# Altium footprint library Connectors.PcbLib: 101 footprints (part 7 of 7)
Each footprint in its own frame and in the unit in brackets; x right, y up, seen from the top. Pads: shape width x height; smd on the part's side, far side on the other; paste and mask are expansions set on the pad; w line width, h text height; cw(c..) or ccw(c..) is an arc to the next point about the centre after c.
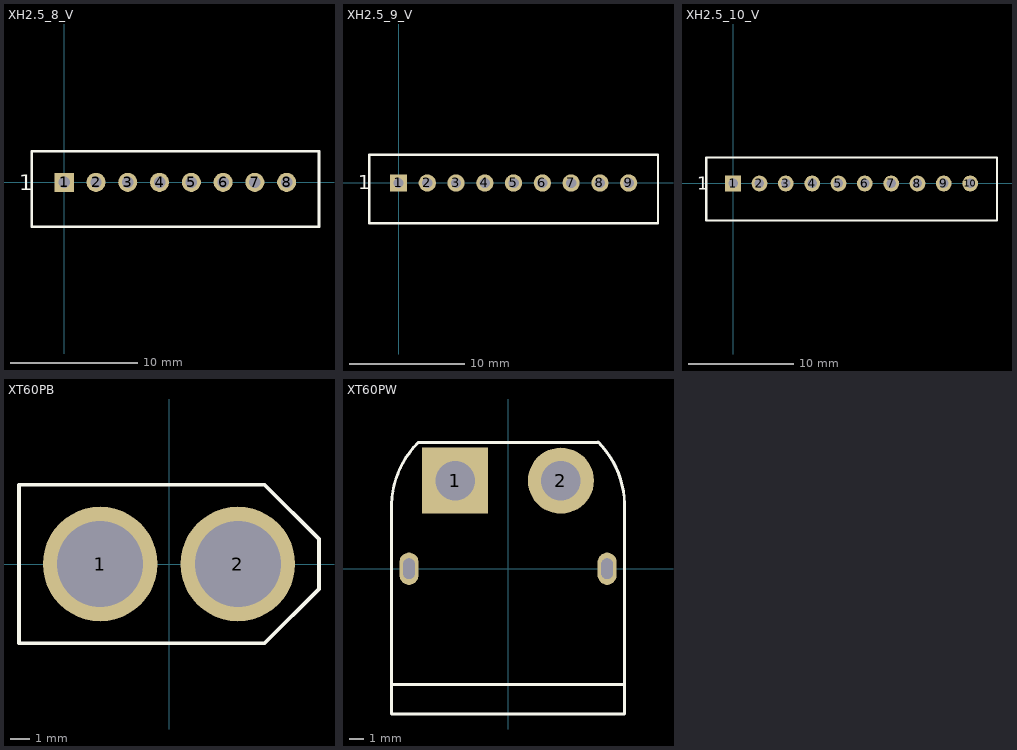
[diagram p6: the footprints below, top view; thin cyan lines are the x and y axes]

## XH2.5_8_V [mm] "XH Connector, 2.5mm Pitch, 8-Pin, Vertical"
pads (8):
  rect 1.5x1.5 hole 0.9 paste+0 mask+0.1: 1(0,0)
  round 1.5 hole 0.9 paste+0 mask+0.1: 2(2.5,0) 3(5,0) 4(7.5,0) 5(10,0) 6(12.5,0) 7(15,0) 8(17.5,0)
Top Overlay:
  lines w0.2: -2.55,-3.5 20.05,-3.5 20.05,2.45 -2.55,2.45 -2.55,-3.5
  text "1" at -3.56,-0.61 h1.2
3D body "B8B-XH-A.STEP": height 7, standoff -3.4, extent -2.45,-3.4 19.95,2.35

## XH2.5_9_V [mm] "XH Connector, 2.5mm Pitch, 9-Pin, Vertical"
pads (9):
  rect 1.5x1.5 hole 0.9 paste+0 mask+0.1: 1(0,0)
  round 1.5 hole 0.9 paste+0 mask+0.1: 2(2.5,0) 3(5,0) 4(7.5,0) 5(10,0) 6(12.5,0) 7(15,0) 8(17.5,0) 9(20,0)
Top Overlay:
  lines w0.2: -2.55,-3.5 22.55,-3.5 22.55,2.45 -2.55,2.45 -2.55,-3.5
  text "1" at -3.52,-0.56 h1.2
3D body "B9B-XH-A.STEP": height 7.02, standoff -3.38, extent -2.45,-3.405 22.45,2.345

## XH2.5_10_V [mm] "XH Connector, 2.5mm Pitch, 10-Pin, Vertical"
pads (10):
  rect 1.5x1.5 hole 0.9 paste+0 mask+0.1: 1(0,0)
  round 1.5 hole 0.9 paste+0 mask+0.1: 2(2.5,0) 3(5,0) 4(7.5,0) 5(10,0) 6(12.5,0) 7(15,0) 8(17.5,0) 9(20,0) 10(22.5,0)
Top Overlay:
  lines w0.2: -2.55,-3.5 25.05,-3.5 25.05,2.45 -2.55,2.45 -2.55,-3.5
  text "1" at -3.43,-0.58 h1.2
3D body "B10B-XH-A.STEP": height 7, standoff -3.4, extent -2.45,-3.4 24.95,2.35

## XT60PB [mm]
height 0.457
pads (2):
  round 6 hole 4.5: 1(-3.6,0) 2(3.6,0)
Top Overlay:
  lines w0.2: -7.85,-4.15 -7.85,4.15 5,4.15 7.85,1.3 7.85,-1.3 5,-4.15 -7.85,-4.15
3D body "XT60 Stecker2.STEP": height 16.4, standoff -5, extent -8.2,-4 7.8,4

## XT60PW [mm]
pads (4):
  rect 4.5x4.5 hole 2.7 paste+0 mask+0.1: 1(-3.6,6)
  round 4.5 hole 2.7 paste+0 mask+0.1: 2(3.6,6)
  oval 1.3x2.2 hole 0.8 slot 1.4 at 90 deg paste+0 mask+0.1: ""(-6.75,0) ""(6.75,0)
Top Overlay:
  lines w0.2: -7.96,-7.9 7.92,-7.9 ; -6.126,8.601 ccw(c-1.64,4.16) -7.95,4 -7.95,-9.9 7.95,-9.9 7.95,4 ccw(c1.61,4.2) 6.14,8.64 ; -6.1,8.6 6.1,8.6
3D body "xt60pw.stp": height 8.4, standoff -2, extent -7.75,-9.95 7.75,8.25